# Altium footprint library TarabusLib_KAP.PcbLib: 504 footprints (part 13 of 32)
Each footprint in its own frame and in the unit in brackets; x right, y up, seen from the top. Pads: shape width x height; smd on the part's side, far side on the other; paste and mask are expansions set on the pad; w line width, h text height; cw(c..) or ccw(c..) is an arc to the next point about the centre after c.
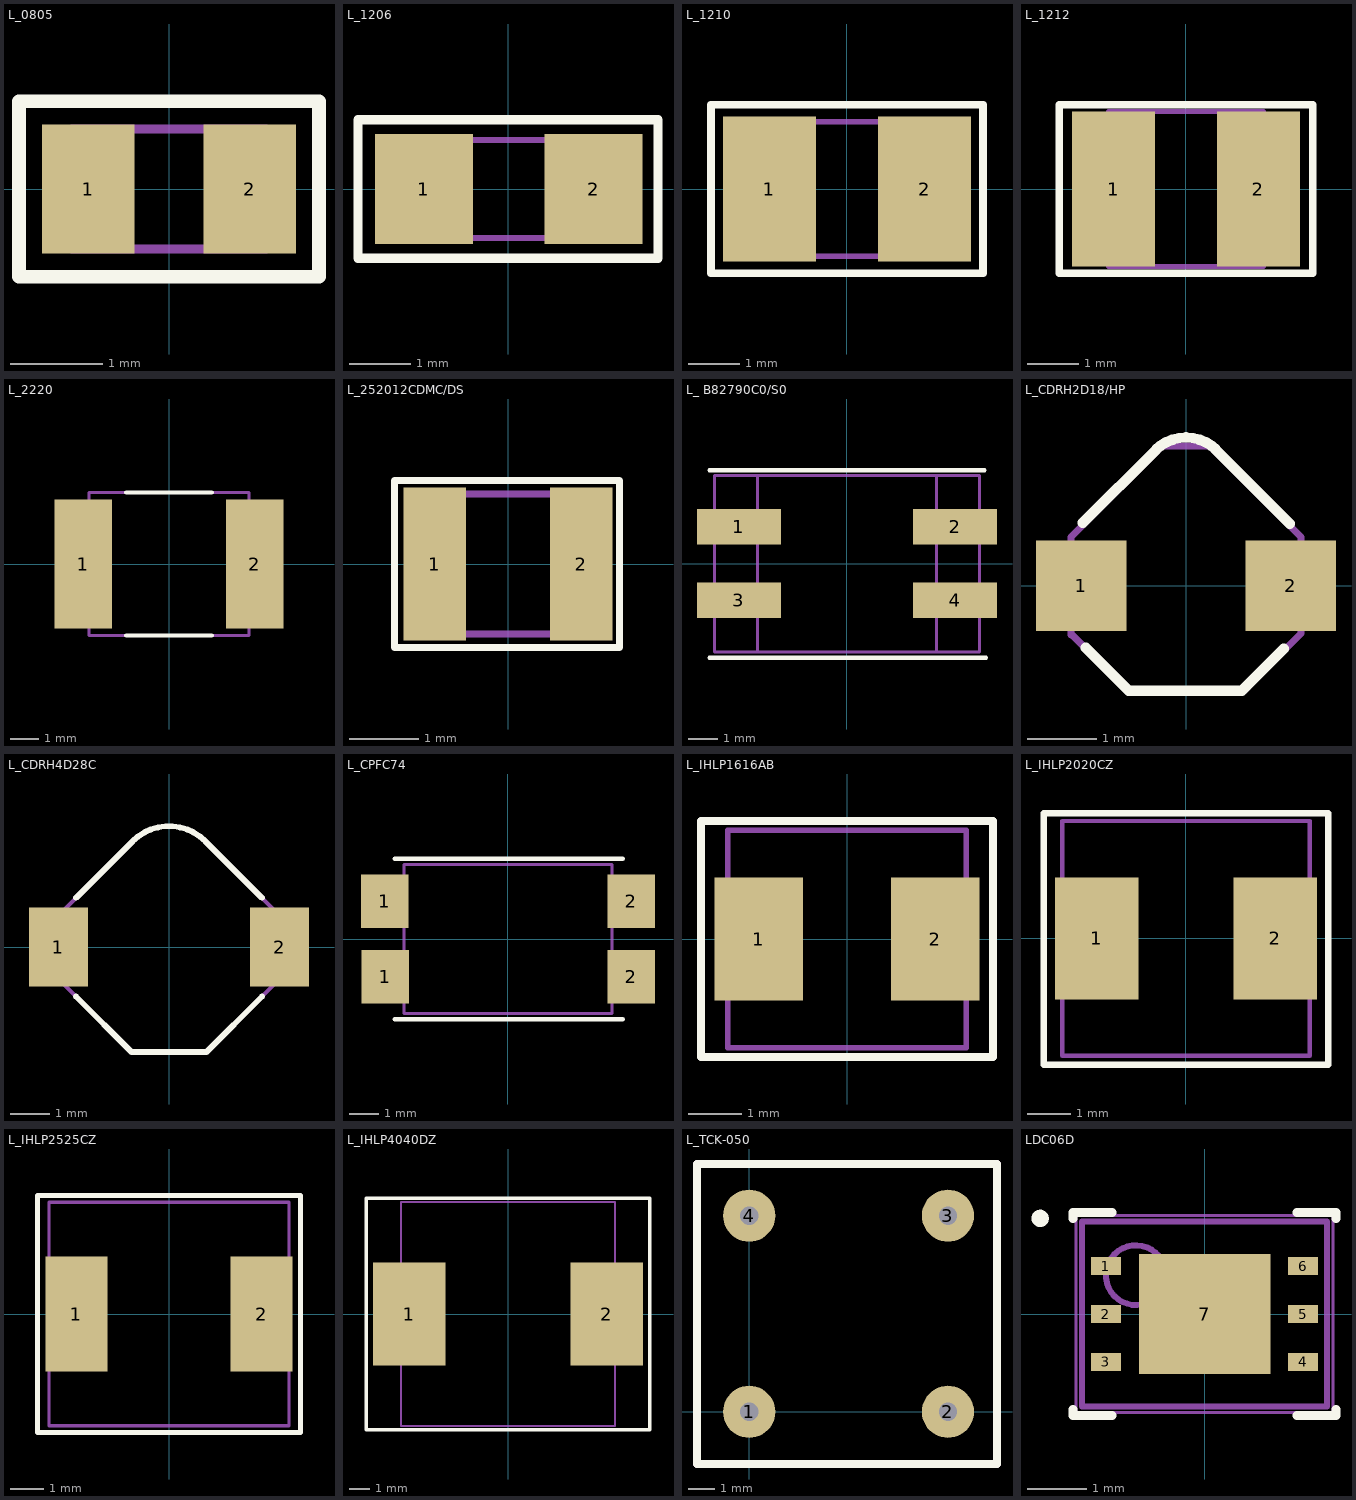
[diagram p12: the footprints below, top view; thin cyan lines are the x and y axes]

## L_0805 [mm]
height 1.4
pads (2):
  rect 1x1.4 smd: 1(-0.875,0) 2(0.875,0)
Top Overlay:
  lines w0.15: -1.625,-0.95 -1.625,0.95 1.625,0.95 1.625,-0.95 -1.625,-0.95
Mechanical 7:
  lines w0.1: -1.05,-0.65 -1.05,0.65 1.05,0.65 1.05,-0.65 -1.05,-0.65
Mechanical 10:
  text ".Designator" at -1.525,1.375 h0.8
  text ".Comment" at -1.125,-1.625 h0.6
3D body: height 1.4, standoff 0, extent -1.05,-0.65 1.05,0.65

## L_1206 [mm]
height 1.5
pads (2):
  rect 1.6x1.8 smd: 1(-1.375,0) 2(1.4,0)
Top Overlay:
  lines w0.15: -2.45,-1.13 2.45,-1.13 2.45,1.13 -2.45,1.13 -2.45,-1.13
Mechanical 7:
  lines w0.1: -1.6,-0.8 -1.6,0.8 1.6,0.8 1.6,-0.8 -1.6,-0.8
Mechanical 10:
  text ".Comment" at -1.075,-1.65 h0.6
  text ".Designator" at -1.375,1.35 h0.8
3D body: height 1.5, standoff 0, extent -1.6,-0.8 1.6,0.8

## L_1210 [mm]
height 0.55
pads (2):
  rect 1.8x2.8 smd: 1(-1.5,0) 2(1.5,0)
Top Overlay:
  lines w0.15: -2.63,-1.63 2.63,-1.63 2.63,1.63 -2.63,1.63 -2.63,-1.63
Mechanical 7:
  lines w0.1: -1.6,-1.3 1.6,-1.3 1.6,1.3 -1.6,1.3 -1.6,-1.3
Mechanical 10:
  text ".Designator" at -0.71,1.89 h0.8
  text ".Comment" at -0.81,-2.25 h0.6
3D body: height 0.55, standoff 0, extent -1.55,-1.3 1.55,1.3

## L_1212 [mm]
height 0.9
pads (2):
  rect 1.6x3 smd: 1(-1.4,0) 2(1.4,0)
Top Overlay:
  lines w0.15: -2.45,-1.63 2.45,-1.63 2.45,1.63 -2.45,1.63 -2.45,-1.63
Mechanical 7:
  lines w0.1: -1.5,-1.5 1.5,-1.5 1.5,1.5 -1.5,1.5 -1.5,-1.5
Mechanical 10:
  text ".Designator" at -0.71,1.89 h0.8
  text ".Comment" at -0.81,-2.25 h0.6
3D body: height 0.9, standoff 0, extent -1.5,-1.5 1.5,1.5

## L_2220 [mm]
height 1.8
pads (2):
  rect 2x4.5 smd: 1(-3,0) 2(3,0)
Top Overlay:
  lines w0.15: -1.5,-2.5 1.5,-2.5 ; -1.5,2.5 1.5,2.5
Mechanical 7:
  lines w0.1: -2.8,-2.5 -2.8,2.5 2.8,2.5 2.8,-2.5 -2.8,-2.5
Mechanical 10:
  text ".Designator" at -0.56,3.04 h0.8
  text ".Comment" at -0.5,-3.49 h0.6
3D body: height 5, standoff 0, extent -2.8,-2.5 2.8,2.5

## L_252012CDMC/DS [mm] "SMD Power Inductor SUMIDA"
height 1.2
pads (2):
  rect 0.9x2.2 smd mask+0: 1(-1.05,0) 2(1.05,0)
Top Overlay:
  lines w0.1: -1.625,-1.2 1.6,-1.2 1.6,1.2 -1.625,1.2 -1.625,-1.2
Mechanical 7:
  lines w0.1: -1.25,-1 1.25,-1 1.25,1 -1.25,1 -1.25,-1
Mechanical 10:
  text ".Designator" at -1.7,1.475 h0.8
  text ".Comment" at -1.725,-1.8 h0.6
3D body: height 1.2, standoff 0.05, extent -1.25,-1 1.25,1

## L_ B82790C0/S0 [mm]
height 5
pads (4):
  rect 2.85x1.2 smd: 1(-3.675,1.25) 2(3.675,1.25) 3(-3.675,-1.25) 4(3.675,-1.25)
Top Overlay:
  lines w0.15: -4.675,-3.2 4.725,-3.2 ; -4.675,3.175 4.675,3.175
Mechanical 7:
  lines w0.1: -3.05,-3 -3.05,3 ; 3.05,-3 3.05,3 ; -4.5,-3 -4.5,3 4.5,3 4.5,-3 -4.5,-3
Mechanical 10:
  text ".Designator" at -1.7,3.625 h0.8
  text ".Comment" at -1.25,-3.9 h0.6
3D body: height 5, standoff 0, extent -3.035,-3 3.075,3

## L_CDRH2D18/HP [mm]
height 2
pads (2):
  rect 1.3x1.3 smd: 1(-1.5,0) 2(1.5,0)
Top Overlay:
  lines w0.15: -1.478,0.903 -0.436,1.945 cw(c0,1.508) 0.436,1.945 ; -1.438,-0.888 -0.823,-1.502 0.798,-1.502 1.4,-0.9 ; 0.425,1.95 1.488,0.888
Mechanical 7:
  lines w0.1: -1.65,-0.707 -1.65,0.7 -0.35,2 0.35,2 1.65,0.7 1.65,-0.685 0.955,-1.381 0.835,-1.5 -0.7,-1.5 -0.835,-1.5 -1.638,-0.697
Mechanical 10:
  text ".Comment" at -1.225,-3.6 h0.6
  text ".Designator" at -1.9,3.425 h0.8
3D body: height 2, standoff 0.05, extent -1.65,-1.5 1.65,2

## L_CDRH4D28C [mm]
height 3
pads (2):
  rect 1.5x2 smd: 1(-2.8,0) 2(2.8,0)
Top Overlay:
  lines w0.15: -2.356,-1.25 -0.955,-2.652 0.955,-2.652 2.356,-1.25 ; -2.353,1.253 -0.919,2.687 cw(c0,1.768) 0.919,2.687 2.353,1.253
Mechanical 7:
  lines w0.1: -2.899,-0.707 -0.955,-2.652 0.955,-2.652 2.899,-0.707 2.899,0.707 0.919,2.687 ccw(c0,1.768) -0.919,2.687 -2.899,0.707 -2.899,-0.707
Mechanical 10:
  text ".Comment" at -1.225,-3.6 h0.6
  text ".Designator" at -1.9,3.425 h0.8
3D body: height 3, standoff 0, extent -1.29,0.47 1.3,3.065
3D body: height 3, standoff 0, extent -2.899,-2.652 2.899,2.687

## L_CPFC74 [mm]
height 5
pads (4):
  rect 1.6x1.8 smd: 1(-4.14,1.27) 1(-4.13,-1.27) 2(4.14,-1.27) 2(4.14,1.27)
Top Overlay:
  lines w0.15: -3.8,-2.7 3.85,-2.7 ; -3.8,2.7 3.85,2.7
Mechanical 7:
  lines w0.1: -3.5,-2.5 -3.5,2.5 3.5,2.5 3.5,-2.5 -3.5,-2.5
Mechanical 10:
  text ".Designator" at -3.35,3.16 h0.8
  text ".Comment" at -3.38,-0.96 h0.6
3D body: height 5, standoff 0, extent -3.5,-2.5 3.5,2.5

## L_IHLP1616AB [mm]
height 1
pads (2):
  rect 1.65x2.3 smd: 1(-1.65,0) 2(1.65,0)
Top Overlay:
  lines w0.15: -2.725,-2.2 -2.725,2.2 2.725,2.2 2.725,-2.2 -2.725,-2.2
Mechanical 7:
  lines w0.1: -2.225,-2.03 2.225,-2.03 2.225,2.03 -2.225,2.03 -2.225,-2.03
Mechanical 10:
  text ".Designator" at -1.425,1.55 h0.8
  text ".Comment" at -1.425,-1.875 h0.6
3D body: height 1.2, standoff 0.05, extent -2.225,-2.025 2.225,2.025

## L_IHLP2020CZ [mm]
height 3
pads (2):
  rect 1.925x2.8 smd: 1(-2.05,0) 2(2.05,0)
Top Overlay:
  lines w0.15: -3.275,-2.9 -3.275,2.875 3.275,2.875 3.275,-2.9 -3.275,-2.9
Mechanical 7:
  lines w0.1: 2.85,-2.7 2.85,2.7 -2.85,2.7 -2.85,-2.7 2.85,-2.7 ; 2.85,-2.7 2.85,-2.7
Mechanical 10:
  text ".Designator" at -1.475,3.125 h0.8
  text ".Comment" at -1.125,-3.525 h0.6
3D body: height 3, standoff 0.05, extent -2.85,-2.7 2.85,2.7

## L_IHLP2525CZ [mm]
height 3
pads (2):
  rect 1.85x3.45 smd: 1(-2.775,0) 2(2.775,0)
Top Overlay:
  lines w0.15: -3.95,-3.55 3.95,-3.55 3.95,3.55 -3.95,3.55 -3.95,-3.55
Mechanical 7:
  lines w0.1: -3.6,-3.35 3.6,-3.35 3.6,3.35 -3.6,3.35 -3.6,-3.35
Mechanical 10:
  text ".Comment" at -1.05,-4.15 h0.6
  text ".Designator" at -1.5,4 h0.8
3D body: height 3, standoff 0.05, extent -3.6,-3.35 3.6,3.35

## L_IHLP4040DZ [mm]
height 4
pads (2):
  rect 3.5x4.95 smd: 1(-4.75,0) 2(4.75,0)
Top Overlay:
  lines w0.15: -6.825,-5.575 6.825,-5.575 6.825,5.575 -6.825,5.575 -6.825,-5.575
Mechanical 7:
  lines w0.1: -5.15,-5.4 5.15,-5.4 5.15,5.4 -5.15,5.4 -5.15,-5.4
Mechanical 10:
  text ".Comment" at -0.975,-6.275 h0.6
  text ".Designator" at -1.9,5.9 h0.8
3D body: height 4, standoff 0.05, extent -5.175,-5.375 5.125,5.4

## L_TCK-050 [mm]
pads (4):
  round 2 hole 0.7: 1(0,0) 2(7.62,0) 3(7.62,7.52) 4(0,7.52)
Top Overlay:
  lines w0.3: -2,-2 9.5,-2 9.5,9.5 -2,9.5 -2,-2
Mechanical 7:
  lines w0.3: -2,-2 9.5,-2 9.5,9.5 -2,9.5 -2,-2
Mechanical 10:
  text ".Designator" at 6.5,11 h0.8
  text ".Comment" at 6.5,10 h0.6
3D body: height 8.8, standoff 0, extent -2,-2 9.5,9.5

## LDC06D [mm] "PSON, 6-Leads, Body 3x4 mm, Pitch 0.8mm, NSC Recommended"
height 0.8
pads (7):
  rect 0.5x0.3 smd paste-0.15 mask+0.051: 1(-1.65,0.8) 2(-1.65,0) 3(-1.65,-0.8) 4(1.65,-0.8) 5(1.65,0) 6(1.65,0.8)
  rect 2.2x2 smd paste-1 mask+0.051: 7(0,0)
Top Overlay:
  circle w0.15: c-2.75,1.6 r0.069
  lines w0.15: -2.2,-1.7 -2.2,-1.6 ; -2.2,1.6 -2.2,1.7 ; -2.195,-1.7 -1.55,-1.7 ; -2.195,1.7 -1.55,1.7 ; 1.55,-1.7 2.195,-1.7 ; 1.55,1.7 2.195,1.7 ; 2.2,-1.7 2.2,-1.6 ; 2.2,1.6 2.2,1.7
Top Paste:
  region: 2,0.15 1.5,0.15 1.5,-0.15 2,-0.15
  rectangle: -2,-0.15 -1.5,0.15
  rectangle: -2,-0.95 -1.5,-0.65
  region: 2,-0.65 1.5,-0.65 1.5,-0.95 2,-0.95
  region: 2,0.95 1.5,0.95 1.5,0.65 2,0.65
  rectangle: -2,0.65 -1.5,0.95
  region: -0.15,0.9 -1,0.9 -1,0.15 -0.15,0.15
  rectangle: 0.15,-0.9 1,-0.15
  region: -0.15,-0.15 -1,-0.15 -1,-0.9 -0.15,-0.9
  rectangle: 0.15,0.15 1,0.9
Mechanical 7:
  lines w0.05: -2.15,-1.65 -2.15,1.65 2.15,1.65 2.15,-1.65 -2.15,-1.65
  lines w0.1: -0.5,0 0.5,0 ; 0,-0.5 0,0.5
Mechanical 9:
  circle w0.1: c-1.15,0.65 r0.5
  lines w0.1: -2.05,-1.55 2.05,-1.55 2.05,1.55 -2.05,1.55 -2.05,-1.55
3D body: height 0.8, standoff 0, extent -2.049,-1.549 2.049,1.549